# Altium integrated library PASSIVE_COMPONENTS.IntLib: 12 symbols
Pins are listed as number, name and electrical type; pins without a type are passive.

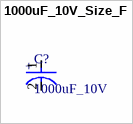
[diagram p0: symbol 1000uF_10V_Size_F]

## 1000uF_10V_Size_F
designator C?, comment 1000uF_10V
footprint 1000uF_10V_Size_F
pins: 1 +, 2 -


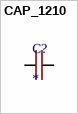
[diagram p1: symbol CAP_1210]

## CAP_1210
designator C?
footprint FP-C1210X475K5RACTU-IPC_A
footprint FP-C1210X475K5RACTU-IPC_B
footprint FP-C1210X475K5RACTU-IPC_C
footprint FP-C1210X475K5RACTU-MFG
pins: 1, 2


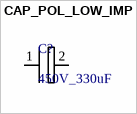
[diagram p2: symbol CAP_POL_LOW_IMP]

## CAP_POL_LOW_IMP
designator C?, comment 450V_330uF
footprint CAP_450V_470uF
footprint CAP_450V_330uF
footprint 500V_470uF
pins: 1, 2


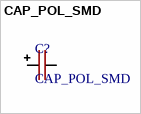
[diagram p3: symbol CAP_POL_SMD]

## CAP_POL_SMD
designator C?
footprint CAP-TAN-B
footprint CAP-TAN-B2
footprint CAP-TAN-D
footprint CAP-TAN-A
footprint CAP-TAN-X
footprint CAP-TAN-C
footprint 1000uF_10V_Size_F
footprint CAP_SMD_Size_G
footprint CAP_SMD_Size_E
footprint CAP_SMD_SIZE_H
pins: 1 +, 2 -


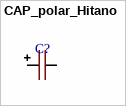
[diagram p4: symbol CAP_polar_Hitano]

## CAP_polar_Hitano
designator C?, comment 1000uF_50V  (value not drawn)
footprint CAP_POL_13x26_1000uF_50V
footprint CAP_50V_2200uF
footprint HITANO 3300uF 25V EHR105
footprint CAP_25V_2200uF
footprint CAP_1000uF_50V
footprint CAP_100V_1500uF
pins: 1 +, 2 -


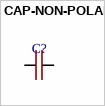
[diagram p5: symbol CAP-NON-POLAR]

## CAP-NON-POLAR
designator C?
footprint CAP-0402
footprint CAP-0201
footprint CAP-0603
footprint CAP-0805
footprint CAP-1206
footprint CAP_1.5uf_400V
footprint CAP_3.3uF_630V
footprint CAP_4.7uF_630V
pins: 1, 2


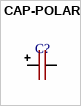
[diagram p6: symbol CAP-POLAR]

## CAP-POLAR
designator C?
footprint CAPPOL-30x35
footprint CAPPOL8x12
footprint CAPPOL-12x25
footprint CAPPOL-10x20
footprint CAP-TAN-A
footprint CAP-TAN-B
footprint CAP-TAN-B2
footprint CAP-TAN-C
footprint CAP-TAN-D
footprint CAP-TAN-R
footprint CAP-TAN-X
footprint CAP 100uF_500V 22x40mm
footprint CAPPOL-16x25
footprint CAP_POL_16x40
footprint CAPPOL-18x40
footprint CAP_POL_36X60
footprint CAP_SMD_Size_E
footprint CAP_SMD_Size_G
pins: 1 +, 2 -


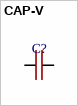
[diagram p7: symbol CAP-V]

## CAP-V
designator C?
footprint CAP-V
pins: 1, 2


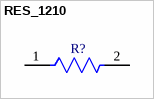
[diagram p8: symbol RES_1210]

## RES_1210
designator R?  (value not drawn)
footprint RES_SMD_1210_IPC_A
footprint RES_SMD_1210_MFG
footprint RES_SMD_1210_IPC_B
footprint RES_SMD_1210_IPC_C
pins: 1, 2


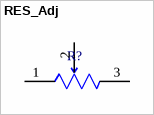
[diagram p9: symbol RES_Adj]

## RES_Adj
designator R?, comment 10K  (value not drawn)
footprint RES_Adj_3296W_Bourns
pins: 1 CCW, 2 WIPER, 3 CW


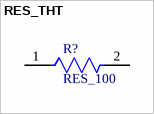
[diagram p10: symbol RES_THT]

## RES_THT
designator R?, comment RES_100
footprint RES_3W
footprint RES_5W_Ceramic_Yageo
footprint FP-SQP500-MFG
footprint RES-2W
footprint RES-2W_2
footprint RES_10W
pins: 1, 2


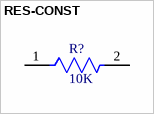
[diagram p11: symbol RES-CONST]

## RES-CONST
designator R?, comment 10K
footprint RES-0603
footprint RES-0201
footprint RES-1206
footprint RES-0402
footprint RES-0805
footprint RES-2512
footprint RES-3921
footprint RES-2W
footprint RES-2W_2
footprint RES_5W_Ceramic_Yageo
footprint RES_10W
pins: 1, 2